# Altium integrated library vh_altium_library.intLib: 963 symbols (part 4 of 5) (continued)
## HEADER-1X3
designator K?
Supplier 1: Digi-Key; Supplier Part Number 1: S1011E-36-ND
footprint HEADER-1X3
pins: 1, 2, 3

## HEADER-1X4
designator K?
Supplier 1: Digi-Key; Supplier Part Number 1: S1011E-36-ND
footprint HEADER-1X4
pins: 1, 2, 3, 4

## HEADER-1X5
designator K?
PINHEADER 1X5; REEL: TH; Supplier 1: Digi-Key; Supplier Part Number 1: S1011E-36-ND
footprint HEADER-1X5
pins: 1, 2, 3, 4, 5

## HEADER-1X6
designator K?
Supplier 1: Digi-Key; Supplier Part Number 1: S1011E-36-ND
footprint HEADER-1X6
pins: 1, 2, 3, 4, 5, 6

## HEADER-1X7
designator K?
Supplier 1: Digi-Key; Supplier Part Number 1: S1011E-36-ND
footprint HEADER-1X7
pins: 1, 2, 3, 4, 5, 6, 7

## HEADER-1X8
designator K?
Supplier 1: Digi-Key; Supplier Part Number 1: S1011E-36-ND
footprint HEADER-1X8
pins: 1, 2, 3, 4, 5, 6, 7, 8

## HEADER-1X9
designator K?
Supplier 1: Digi-Key; Supplier Part Number 1: S1011E-36-ND
footprint HEADER-1X9
pins: 1, 2, 3, 4, 5, 6, 7, 8, 9

## HEADER-2X2
designator K?
footprint HEADER-2X2
pins: 1, 2, 3, 4

## HEADER-2X3
designator K?
footprint HEADER-2X3 (Footprint not found)
pins: 1, 2, 3, 4, 5, 6

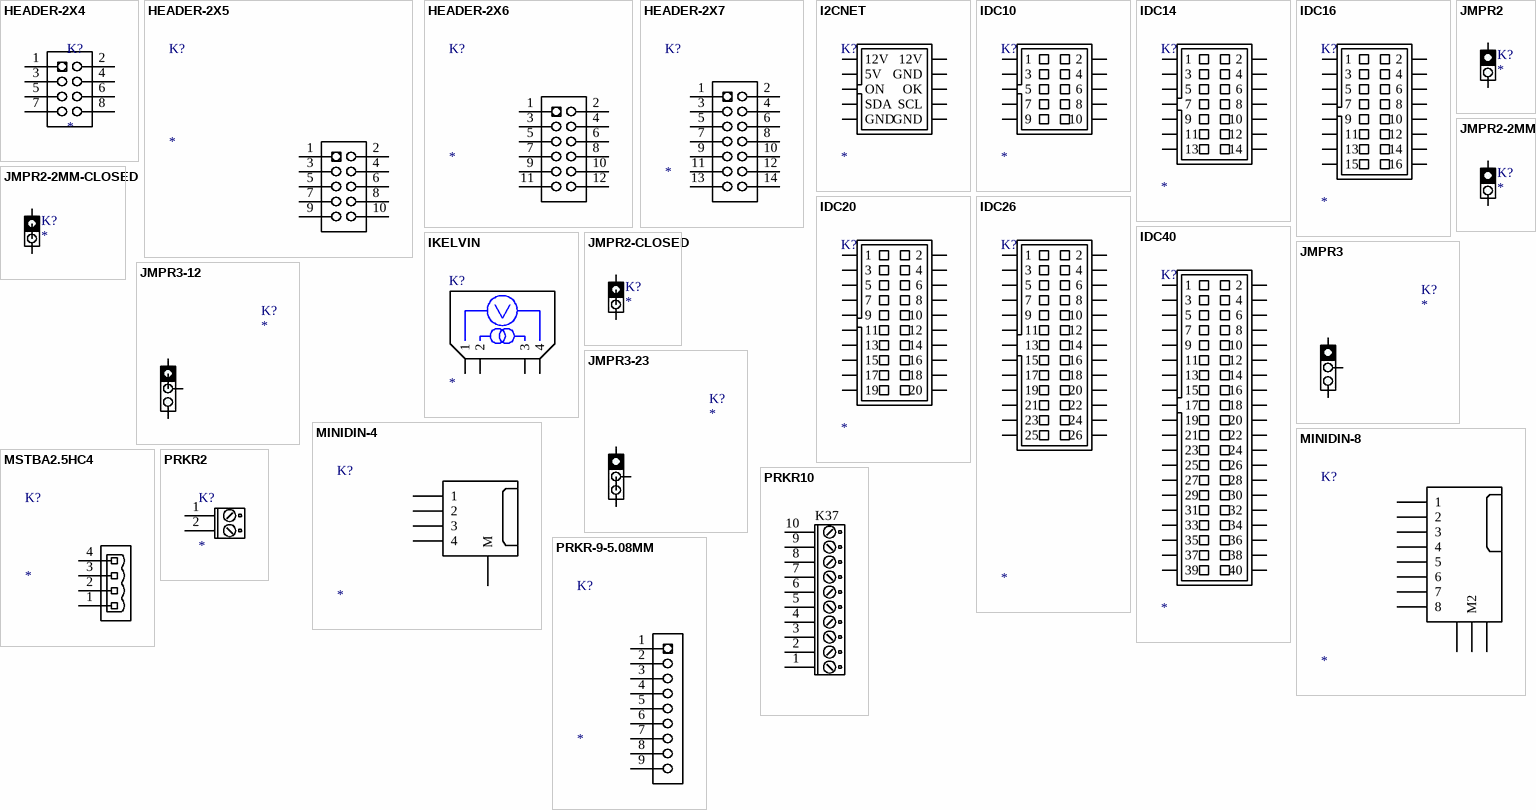
[diagram p50: symbols HEADER-2X4 to PRKR-9-5.08MM]

## HEADER-2X4
designator K?
footprint HEADER-2X4 (Footprint not found)
pins: 1, 2, 3, 4, 5, 6, 7, 8

## HEADER-2X5
designator K?
footprint HEADER-2X5
pins: 1, 2, 3, 4, 5, 6, 7, 8, 9, 10

## HEADER-2X6
designator K?
footprint HEADER-2X6 (Footprint not found)
pins: 1, 2, 3, 4, 5, 6, 7, 8, 9, 10, 11, 12

## HEADER-2X7
designator K?
footprint HEADER-2X7 (Footprint not found)
pins: 1, 2, 3, 4, 5, 6, 7, 8, 9, 10, 11, 12, 13, 14

## I2CNET
designator K?
I2C NET 10 PIN IDC
footprint IDC10-B
footprint IDC10-E
pins: 1 12V, 2 12V, 3 5V, 4 GND, 5 ON, 6 OK, 7 SDA, 8 SCL, 9 GND, 10 GND

## IDC10
designator K?
BOXHEADER 10 PIN; Manufacturer: Assmann Electronics Inc; Manufacturer Part Number: AWHW10G-0202-T-R; Connector Type: Header, Shrouded; Description: CONN HEADER LOW-PRO 10POS GOLD; Number of Positions: 10; Number of Positions Loaded: All; Pitch: 0.100" (2.54mm); Supplier 1: Digi-Key; Supplier Part Number 1: HRP10H-ND; Supplier: Digi-Key; Contact Type: Male Pin; RoHS: RoHS Compliant; Supplier Part Number: HRP10H-ND; Category: Connectors, Interconnects; Number of Rows: 2; Row Spacing: 0.100" (2.54mm); Contact Mating Length: -; Mounting Type: Through Hole; Termination: Solder; Fastening Type: -; Features: -; Contact Finish: Gold; Contact Finish Thickness: Flash; Color: Gray; Packaging: Tray
footprint IDC10-B
footprint IDC10-E
pins: 1, 2, 3, 4, 5, 6, 7, 8, 9, 10

## IDC14
designator K?
BOXHEADER 14 PIN; Manufacturer Part Number: AWHW14G-0202-T-R; Manufacturer: Assmann Electronics Inc; Description: CONN HEADER LOW-PRO 14POS GOLD; Connector Type: Header, Shrouded; Number of Positions Loaded: All; Number of Positions: 14; Pitch: 0.100" (2.54mm); Supplier 1: Digi-Key; Supplier Part Number 1: HRP14H-ND; Category: Connectors, Interconnects; Supplier Part Number: HRP14H-ND; Supplier: Digi-Key; RoHS: RoHS Compliant; Contact Type: Male Pin; Color: Gray; Number of Rows: 2; Mounting Type: Through Hole; Contact Mating Length: -; Features: -; Packaging: Tray; Termination: Solder; Contact Finish Thickness: Flash; Contact Finish: Gold; Fastening Type: -; Row Spacing: 0.100" (2.54mm)
footprint IDC14-B
footprint IDC14-E (idc14 edge soldered)
pins: 1, 2, 3, 4, 5, 6, 7, 8, 9, 10, 11, 12, 13, 14

## IDC16
designator K?
BOXHEADER 16 PIN; Manufacturer Part Number: AWHW16G-0202-T-R; Manufacturer: Assmann Electronics Inc; Number of Positions Loaded: All; Pitch: 0.100" (2.54mm); Description: CONN HEADER LOW-PRO 16POS GOLD; Connector Type: Header, Shrouded; Number of Positions: 16; Supplier 1: Digi-Key; Supplier Part Number 1: HRP16H-ND; Contact Finish Thickness: Flash; Color: Gray; Row Spacing: 0.100" (2.54mm); Termination: Solder; Supplier Part Number: HRP16H-ND; Fastening Type: -; Contact Finish: Gold; Category: Connectors, Interconnects; Contact Type: Male Pin; Features: -; Supplier: Digi-Key; Packaging: Tray; Mounting Type: Through Hole; RoHS: RoHS Compliant; Contact Mating Length: -; Number of Rows: 2
footprint IDC16-B
pins: 1, 2, 3, 4, 5, 6, 7, 8, 9, 10, 11, 12, 13, 14, 15, 16

## IDC20
designator K?
BOXHEADER 20 PIN; Manufacturer: Assmann Electronics Inc; Manufacturer Part Number: AWHW20G-0202-T-R; Description: CONN HEADER LOW-PRO 20POS GOLD; Number of Positions: 20; Number of Positions Loaded: All; Pitch: 0.100" (2.54mm); Connector Type: Header, Shrouded; Supplier 1: Digi-Key; Supplier Part Number 1: HRP20H-ND; Contact Type: Male Pin; Fastening Type: -; Contact Mating Length: -; Contact Finish Thickness: Flash; Number of Rows: 2; RoHS: RoHS Compliant; Category: Connectors, Interconnects; Packaging: Tray; Mounting Type: Through Hole; Contact Finish: Gold; Color: Gray; Features: -; Supplier: Digi-Key; Row Spacing: 0.100" (2.54mm); Supplier Part Number: HRP20H-ND; Termination: Solder
footprint IDC20-B
footprint IDC20-E (IDC20 EDGE SOLDERED)
pins: 1, 2, 3, 4, 5, 6, 7, 8, 9, 10, 11, 12, 13, 14, 15, 16, 17, 18, 19, 20

## IDC26
designator K?
BOXHEADER 26 PIN; Manufacturer: Assmann Electronics Inc; Manufacturer Part Number: AWHW26G-0202-T-R; Pitch: 0.100" (2.54mm); Connector Type: Header, Shrouded; Number of Positions: 26; Number of Positions Loaded: All; Description: CONN HEADER LOW-PRO 26POS GOLD; Supplier 1: Digi-Key; Supplier Part Number 1: HRP26H-ND; RoHS: RoHS Compliant; Supplier: Digi-Key; Number of Rows: 2; Contact Type: Male Pin; Packaging: Tray; Color: Gray; Row Spacing: 0.100" (2.54mm); Contact Finish: Gold; Contact Finish Thickness: Flash; Supplier Part Number: HRP26H-ND; Mounting Type: Through Hole; Contact Mating Length: -; Termination: Solder; Fastening Type: -; Category: Connectors, Interconnects; Features: -
footprint IDC26-B
footprint IDC26-E (IDC26 EDGE SOLDERED)
pins: 1, 2, 3, 4, 5, 6, 7, 8, 9, 10, 11, 12, 13, 14, 15, 16, 17, 18, 19, 20, 21, 22, 23, 24, 25, 26

## IDC40
designator K?
BOXHEADER 40 PIN; Manufacturer: Assmann Electronics Inc; Manufacturer Part Number: AWHW40G-0202-T-R; Description: CONN HEADER LOW-PRO 40POS GOLD; Row Spacing: 0.100" (2.54mm); Connector Type: Header, Shrouded; Number of Positions Loaded: All; Number of Positions: 40; Supplier 1: Digi-Key; Supplier Part Number 1: HRP40H-ND; Supplier: Digi-Key; Color: Gray; Termination: Solder; Contact Type: Male Pin; Features: -; Fastening Type: -; Category: Connectors, Interconnects; Supplier Part Number: HRP40H-ND; Contact Finish Thickness: Flash; RoHS: RoHS Compliant; Mounting Type: Through Hole; Contact Mating Length: -; Contact Finish: Gold; Packaging: Tray; Pitch: 0.100" (2.54mm); Number of Rows: 2
footprint IDC40-B (Footprint not found)
pins: 1, 2, 3, 4, 5, 6, 7, 8, 9, 10, 11, 12, 13, 14, 15, 16, 17, 18, 19, 20, 21, 22, 23, 24, 25, 26, 27, 28, 29, 30, 31, 32, 33, 34, 35, 36, 37, 38, 39, 40

## IKELVIN
designator K?
KELVIN CONTACT
footprint JMPR2X2
pins: 1, 2, 3, 4

## JMPR2
designator K?
JMPR2 OPEN BY DEFAULT; Manufacturer: Sullins Connector Solutions; Manufacturer Part Number: PBC36SAAN; Description: CONN HEADER .100 SINGL STR 36POS; Supplier 1: Digi-Key; Supplier Part Number 1: S1011E-36-ND; Reel: Open
footprint JMPR2
pins: 1, 2
2 alternate drawings of the same symbol

## JMPR2-2MM
designator K?
JMPR2 2MM OPEN BY DEFAULT; Manufacturer: Sullins Connector Solutions; Manufacturer Part Number: PBC36SAAN; Description: CONN HEADER .100 SINGL STR 36POS; Supplier 1: Digi-Key; Supplier Part Number 1: S1011E-36-ND; Reel: Open
footprint JMPR2-2MM (2 PIN JUMPER 2MM PITCH)
pins: 1, 2
2 alternate drawings of the same symbol

## JMPR2-2MM-CLOSED
designator K?
JMPR2 2MM PITCH CLOSED BY DEAFULT; Manufacturer: Sullins Connector Solutions; Manufacturer Part Number: PBC36SAAN; Description: CONN HEADER .100 SINGL STR 36POS; Supplier 1: Digi-Key; Supplier Part Number 1: S1011E-36-ND; Reel: Closed
footprint JMPR2-2mm-CLOSED (2 PIN JUMPER 2MM PITCH)
pins: 1, 2
2 alternate drawings of the same symbol

## JMPR2-CLOSED
designator K?
JMPR2 CLOSED BY DEFAULT; Manufacturer: Sullins Connector Solutions; Manufacturer Part Number: PBC36SAAN; Description: CONN HEADER .100 SINGL STR 36POS; Supplier 1: Digi-Key; Supplier Part Number 1: S1011E-36-ND; Reel: Closed
footprint JMPR2-CLOSED
pins: 1, 2
2 alternate drawings of the same symbol

## JMPR3
designator K?
JMPR3; Manufacturer: Sullins Connector Solutions; Manufacturer Part Number: PBC36SAAN; Description: CONN HEADER .100 SINGL STR 36POS; Reel: Open; Supplier 1: Digi-Key; Supplier Part Number 1: S1011E-36-ND
footprint JMPR3
pins: 1, 2, 3

## JMPR3-12
designator K?
JMPR3; Manufacturer: Sullins Connector Solutions; Manufacturer Part Number: PBC36SAAN; Description: CONN HEADER .100 SINGL STR 36POS; Reel: Closed 1-2; Supplier 1: Digi-Key; Supplier Part Number 1: S1011E-36-ND
footprint JMPR3-CLOSED-12
pins: 1, 2, 3

## JMPR3-23
designator K?
JMPR3; Manufacturer: Sullins Connector Solutions; Manufacturer Part Number: PBC36SAAN; Description: CONN HEADER .100 SINGL STR 36POS; Reel: Closed 2-3; Supplier 1: Digi-Key; Supplier Part Number 1: S1011E-36-ND
footprint JMPR3-CLOSED-23
pins: 1, 2, 3

## MINIDIN-4
designator K?
MINIDIN 4 PIN; Text Field1: CUI; Text Field2: MD-40SG; Text Field3: DIGIKEY; Text Field4: CP5040-ND
pins: 1, 2, 3, 4, M, N, O

## MINIDIN-8
designator K?
MINIDIN 8 PIN; Text Field1: CUI; Text Field2: MD-40SG; Text Field3: DIGIKEY; Text Field4: CP5040-ND
pins: 1, 2, 3, 4, 5, 6, 7, 8, M1, M2, M3

## MSTBA2.5HC4
designator K?
PHOENIX CONTACT MSTBA 2.5 HC 4 G 5.08
footprint PRKR4A
pins: 1, 2, 3, 4

## PRKR2
designator K?
SCREW TERMINAL 5MM
footprint PRKR2
pins: 1, 2

## PRKR10
designator K37
footprint PRKR10-3.8MM
footprint PRKR10-3.8MM
pins: 1, 2, 3, 4, 5, 6, 7, 8, 9, 10

## PRKR-9-5.08MM
designator K?
Supplier 1: Digi-Key; Supplier Part Number 1: S1011E-36-ND
footprint PRKR-9-5.08MM
pins: 1, 2, 3, 4, 5, 6, 7, 8, 9

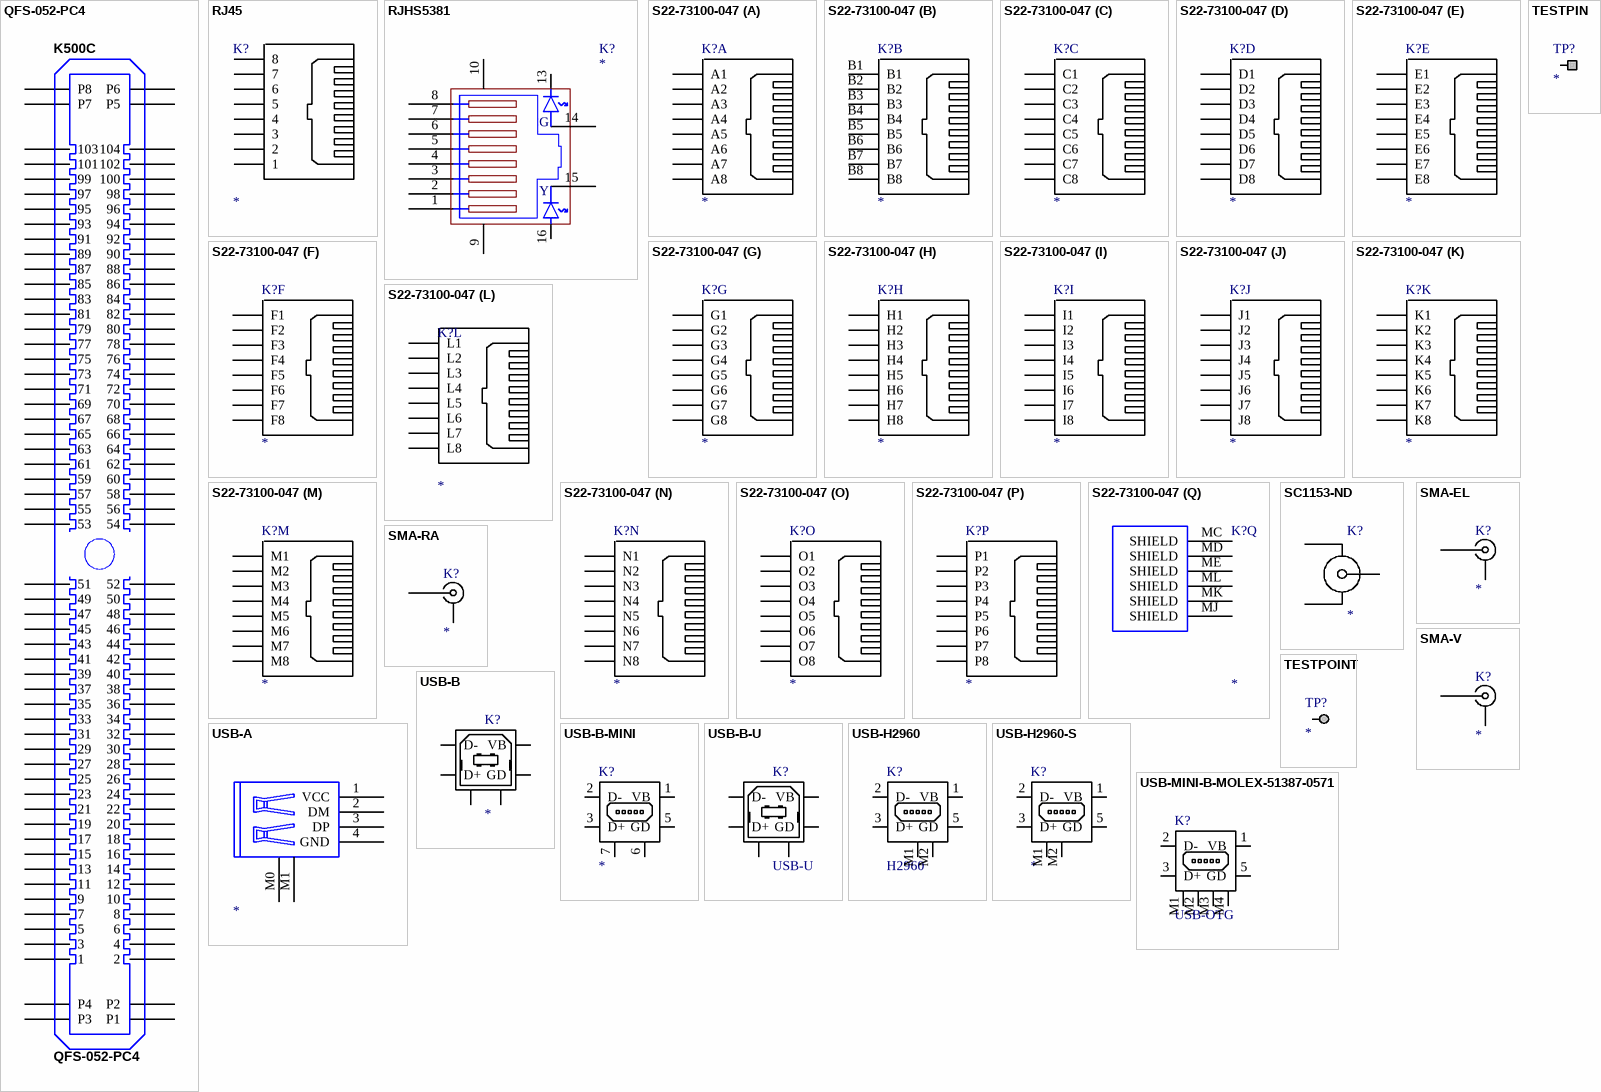
[diagram p51: symbols QFS-052-PC4 to USB-MINI-B-MOLEX-51387-0571]

## QFS-052-PC4
designator K500C
SAMTEC BOARD TO BOARD CONNECTOR; Part Field 1: QFS-052-01-X-D-PC4; REEL: TH; Part Field 2: QFS-052-01-L-D-PC4; Part Field 3: SAMTEC; Part Field 4: QFS-052-01-L-D-PC4; Part Field 5: CONNECTOR
footprint QFS-052-01-X-D-PC4
pins: 1, 2, 3, 4, 5, 6, 7, 8, 9, 10, 11, 12, 13, 14, 15, 16, 17, 18, 19, 20, 21, 22, 23, 24, 25, 26, 27, 28, 29, 30, 31, 32, 33, 34, 35, 36, 37, 38, 39, 40, 41, 42, 43, 44, 45, 46, 47, 48, 49, 50, 51, 52, 53, 54, 55, 56, 57, 58, 59, 60, 61, 62, 63, 64, 65, 66, 67, 68, 69, 70, 71, 72, 73, 74, 75, 76, 77, 78, 79, 80, 81, 82, 83, 84, 85, 86, 87, 88, 89, 90, 91, 92, 93, 94, 95, 96, 97, 98, 99, 100, 101, 102, 103, 104, P1, P2, P3, P4, P5, P6, P7, P8

## RJ45
designator K?
RJ45; Text Field1: STEWART CONNECTOR; Text Field2: SS-73100-047; Text Field3: DIGIKEY; Text Field4: 380-1053-ND
footprint RJ45-8/8
pins: 1, 2, 3, 4, 5, 6, 7, 8

## RJHS5381
designator K?
Connector, RJ45 with Leds, (Ethernet), Thru-Hole
footprint RJHS5381
pins: 1, 2, 3, 4, 5, 6, 7, 8, 9, 10, 13, 14, 15, 16
text: G; Y

## S22-73100-047
designator K?
16 X RJ45 SHIELDED STEWART CONNECTOR; Text Field2: SS-73100-047; Text Field3: DIGIKEY; Text Field4: 380-1053-ND; Text Field1: STEWART CONNECTOR
footprint SS-73100-047
part A pins: A1, A2, A3, A4, A5, A6, A7, A8
part B pins: B1, B2, B3, B4, B5, B6, B7, B8
part C pins: C1, C2, C3, C4, C5, C6, C7, C8
part D pins: D1, D2, D3, D4, D5, D6, D7, D8
part E pins: E1, E2, E3, E4, E5, E6, E7, E8
part F pins: F1, F2, F3, F4, F5, F6, F7, F8
part G pins: G1, G2, G3, G4, G5, G6, G7, G8
part H pins: H1, H2, H3, H4, H5, H6, H7, H8
part I pins: I1, I2, I3, I4, I5, I6, I7, I8
part J pins: J1, J2, J3, J4, J5, J6, J7, J8
part K pins: K1, K2, K3, K4, K5, K6, K7, K8
part L pins: L1, L2, L3, L4, L5, L6, L7, L8
part M pins: M1, M2, M3, M4, M5, M6, M7, M8
part N pins: N1, N2, N3, N4, N5, N6, N7, N8
part O pins: O1, O2, O3, O4, O5, O6, O7, O8
part P pins: P1, P2, P3, P4, P5, P6, P7, P8
part Q pins: MC SHIELD, MD SHIELD, ME SHIELD, MJ SHIELD, MK SHIELD, ML SHIELD

## SC1153-ND
designator K?
Connector, Power Jack, Mini .08", Right Angle, Thru-Hole; Manufacturer Part Number: RAPC722; Manufacturer: Switchcraft Inc.; Number of Positions/Contacts: 2 Conductors, 2 Contacts; Description: CONNN POWERJACK MINI.08" RA PCMT; Internal Switch(s): Single Switch, Normally Closed; Plug/Mating Plug Diameter: 2.1mm ID, 5.5mm OD; Gender: Male; Shielding: Unshielded; Mounting Type: Through Hole, Right Angle; Color: Black; RoHS: RoHS non-compliant; Connector Type: Jack; Features: -; Signal Lines: -; Supplier: Digi-Key; Termination: Solder Eyelet(s); Category: Connectors, Interconnects; REEL: *; Supplier 1: Digi-Key; Supplier Part Number: SC1153-ND; Supplier Part Number 1: SC1153-ND
footprint DCPOWER
pins: 1, 2, 3

## SMA-EL
designator K?
SMA THREADED RF CONNECTOR VERTICAL
footprint SMA-ENDLAUNCH
pins: 1, 2, 3, 4, 5

## SMA-RA
designator K?
SMA THREADED RF CONNECTOR VERTICAL
footprint SMA-RA
pins: 1, 2, 3, 4, 5

## SMA-V
designator K?
SMA THREADED RF CONNECTOR VERTICAL
footprint SMA-V
pins: 1, 2, 3, 4, 5

## TESTPIN
designator TP?
TESTPIN SINGLE PIN HEADER; Manufacturer 1: Sharon Long Industries; Manufacturer Part Number 1: Cut-it-yourself; Reel: TH; Description: Single pin header; Supplier 1: Sharon Long Industries; Supplier 1 Part number: Cut-It-Yourself
footprint TESTPIN
pins: 1

## TESTPOINT
designator TP?
TESTPOINT SCOPE GRABBER; Manufacturer Part Number: 5010; Manufacturer: Keystone Electronics; Description: TEST POINT PC MULTI PURPOSE RED; Reel: TH; Supplier 1: Digi-Key; Supplier Part Number 1: 5010K-ND
footprint TESTPOINT
pins: 1

## USB-A
designator ?
USB A HOST CONNECTOR
pins: 1 VCC, 2 DM, 3 DP, 4 GND, M0, M1

## USB-B
designator K?
USB B DEVICE CONNECTOR; Text Field1: Assmann; Text Field2: AU-Y1007; Text Field3: Digi-Key; Text Field4: AE1085-ND; Text Field5: Thru-Hole; Text Field6: 1.168; NI?: *; O?: *; Section:: *
footprint USB-B
pins: 1 VB, 2 D-, 3 D+, 4 GD, 5, 6

## USB-B-MINI
designator K?
MINI USB B DEVICE CONNECTOR
footprint USB-MINI-B
pins: 1 VB, 2 D-, 3 D+, 5 GD, 6, 7

## USB-B-U
designator K?, comment USB-U
USB B DEVICE CONNECTOR
footprint USB-B-U
pins: 1 VB, 2 D-, 3 D+, 4 GD, 5, 6

## USB-H2960
designator K?, comment H2960
MINI USB B DEVICE CONNECTOR
footprint usb-mini-b
pins: 1 VB, 2 D-, 3 D+, 5 GD, M1, M2

## USB-H2960-S
designator K?
MINI USB B DEVICE CONNECTOR
pins: 1 VB, 2 D-, 3 D+, 5 GD, M1, M2

## USB-MINI-B-MOLEX-51387-0571
designator K?, comment USB-OTG
MINI USB B DEVICE CONNECTOR MOLEX 51387-0571; Supplier 1: Digi-Key; Supplier Part Number 1: WM5462DKR-ND
footprint USB-MINI-B-51387-0571 (MOLEX 51387-0571)
pins: 1 VB, 2 D-, 3 D+, 5 GD, M1, M2, M3, M4


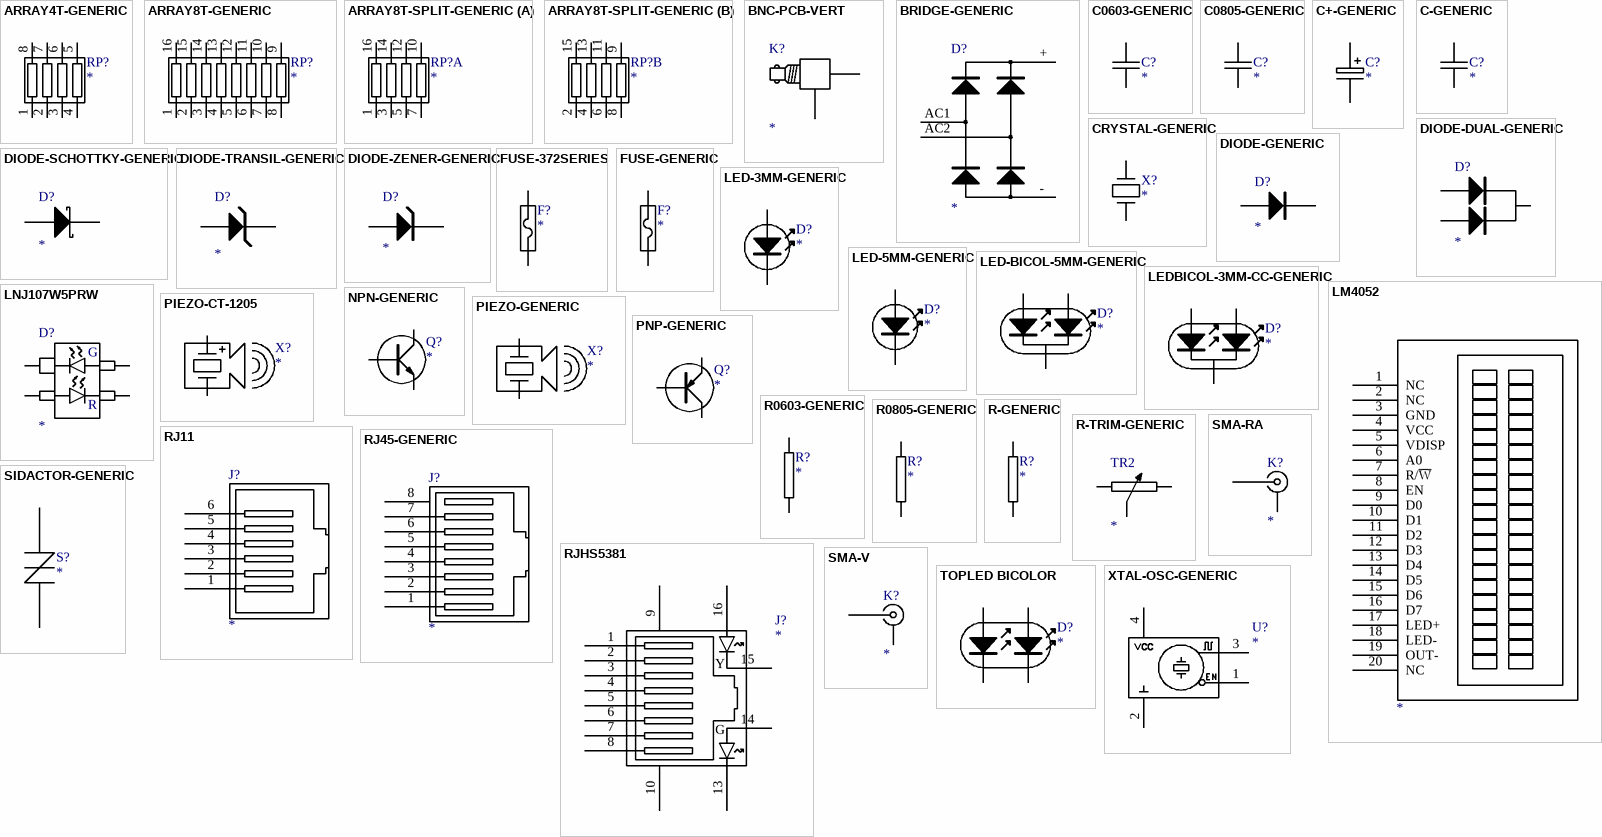
[diagram p52: symbols ARRAY4T-GENERIC to XTAL-OSC-GENERIC]

## ARRAY4T-GENERIC
designator RP?
GENERIC RESISTOR ARRAY 4X INDEPENDENT
footprint 1206-ARRAY-4-GENERIC
pins: 1, 2, 3, 4, 5, 6, 7, 8

## ARRAY8T-GENERIC
designator RP?
GENERIC RESISTOR ARRAY 8X INDEPENDENT
footprint 1206-ARRAY-8-GENERIC
pins: 1, 2, 3, 4, 5, 6, 7, 8, 9, 10, 11, 12, 13, 14, 15, 16

## ARRAY8T-SPLIT-GENERIC
designator RP?
GENERIC RESISTOR ARRAY 4X INDEPENDENT
footprint 1206-ARRAY-8-GENERIC
part A pins: 1, 3, 5, 7, 10, 12, 14, 16
part B pins: 2, 4, 6, 8, 9, 11, 13, 15

## BNC-PCB-VERT
designator K?
GENERIC BNC CONNECTOR
pins: 1, 2 GND, A, B

## BRIDGE-GENERIC
designator D?
GENERIC RECTIFIER BRIDGE
pins: +, -, AC1, AC2

## C0603-GENERIC
designator C?
GENERIC CAPACITOR NON POLARISED 0603
footprint 0603C-GENERIC (CAPACITOR 0805)
pins: 1, 2

## C0805-GENERIC
designator C?
GENERIC CAPACITOR NON POLARISED0603
footprint 0805C-GENERIC (CAPACITOR 0805)
pins: 1, 2

## C+-GENERIC
designator C?
GENERIC CAPACITOR POLARISED
pins: +, -

## C-GENERIC
designator C?
GENERIC CAPACITOR NONPOLARISED
pins: 1, 2

## CRYSTAL-GENERIC
designator X?
GENERIC CRYSTAL
footprint XTAL-RU49/4
pins: 1, 2

## DIODE-DUAL-GENERIC
designator D?
GENERIC DUAL DIODE
pins: A1, A2, K

## DIODE-GENERIC
designator D?
GENERIC DIODE
pins: A, K

## DIODE-SCHOTTKY-GENERIC
designator D?
GENERIC SCHOTTKY DIODE
footprint SOT23-DIODE
pins: A, K

## DIODE-TRANSIL-GENERIC
designator D?
GENERIC TRANSIL
footprint DIODE-SMB
pins: A, K

## DIODE-ZENER-GENERIC
designator D?
GENERIC ZENER DIODE
footprint SOT23-DIODE
pins: A, K

## FUSE-372SERIES
designator F?
FUSE-372
footprint FUSE-372
pins: 1, 2

## FUSE-GENERIC
designator F?
GENERIC FUSE
pins: 1, 2

## LED-3MM-GENERIC
designator D?
GENERIC LED 3MM
pins: A, K

## LED-5MM-GENERIC
designator D?
GENERIC LED 5MM
pins: A, K

## LED-BICOL-5MM-GENERIC
designator D?
LED3 / LED5
pins: A1, A2, K

## LEDBICOL-3MM-CC-GENERIC
designator D?
LED 3MM BICILOR COMMON CATHODE
pins: A1, A2, K

## LM4052
designator ?
LCD display 20x2
pins: 1 NC, 2 NC, 3 GND, 4 VCC, 5 VDISP, 6 A0, 7 R/~{W}, 8 EN, 9 D0, 10 D1, 11 D2, 12 D3, 13 D4, 14 D5, 15 D6, 16 D7, 17 LED+, 18 LED-, 19 OUT-, 20 NC

## LNJ107W5PRW
designator D?
pins: 1, 2, 3, 4
text: G; R

## NPN-GENERIC
designator Q?
NPN BIPOLAR TRANSISTOR
footprint SOT23-BCE
pins: B, C, E

## PIEZO-CT-1205
designator X?
piezo buzzer; Supplier 1: Digi-Key; Supplier Part Number 1: 102-1267-2-ND
footprint PIEZO-CT-1205
pins: +, -

## PIEZO-GENERIC
designator X?
GENERIC PIEZO BUZZER NON OSCILLATING
footprint BZ13MM
pins: 1, 2

## PNP-GENERIC
designator Q?
GENERIC PNP BIPOLAR TRANSISTOR
footprint SOT23-BCE
pins: B, C, E

## R0603-GENERIC
designator R?
GENERIC RESISTOR 0603
footprint 0603R-GENERIC (RESISTOR 0603)
pins: 1, 2

## R0805-GENERIC
designator R?
GENERIC RESISTOR 0805
footprint 0805R-GENERIC (RESISTOR 0805)
pins: 1, 2

## R-GENERIC
designator R?
GENERIC THROUGH HOLE 1/4 WATT RESISTOR
footprint R
pins: 1, 2